# Altium footprint library Connectors.PcbLib: 155 footprints (part 7 of 10)
Each footprint in its own frame and in the unit in brackets; x right, y up, seen from the top. Pads: shape width x height; smd on the part's side, far side on the other; paste and mask are expansions set on the pad; w line width, h text height; cw(c..) or ccw(c..) is an arc to the next point about the centre after c.
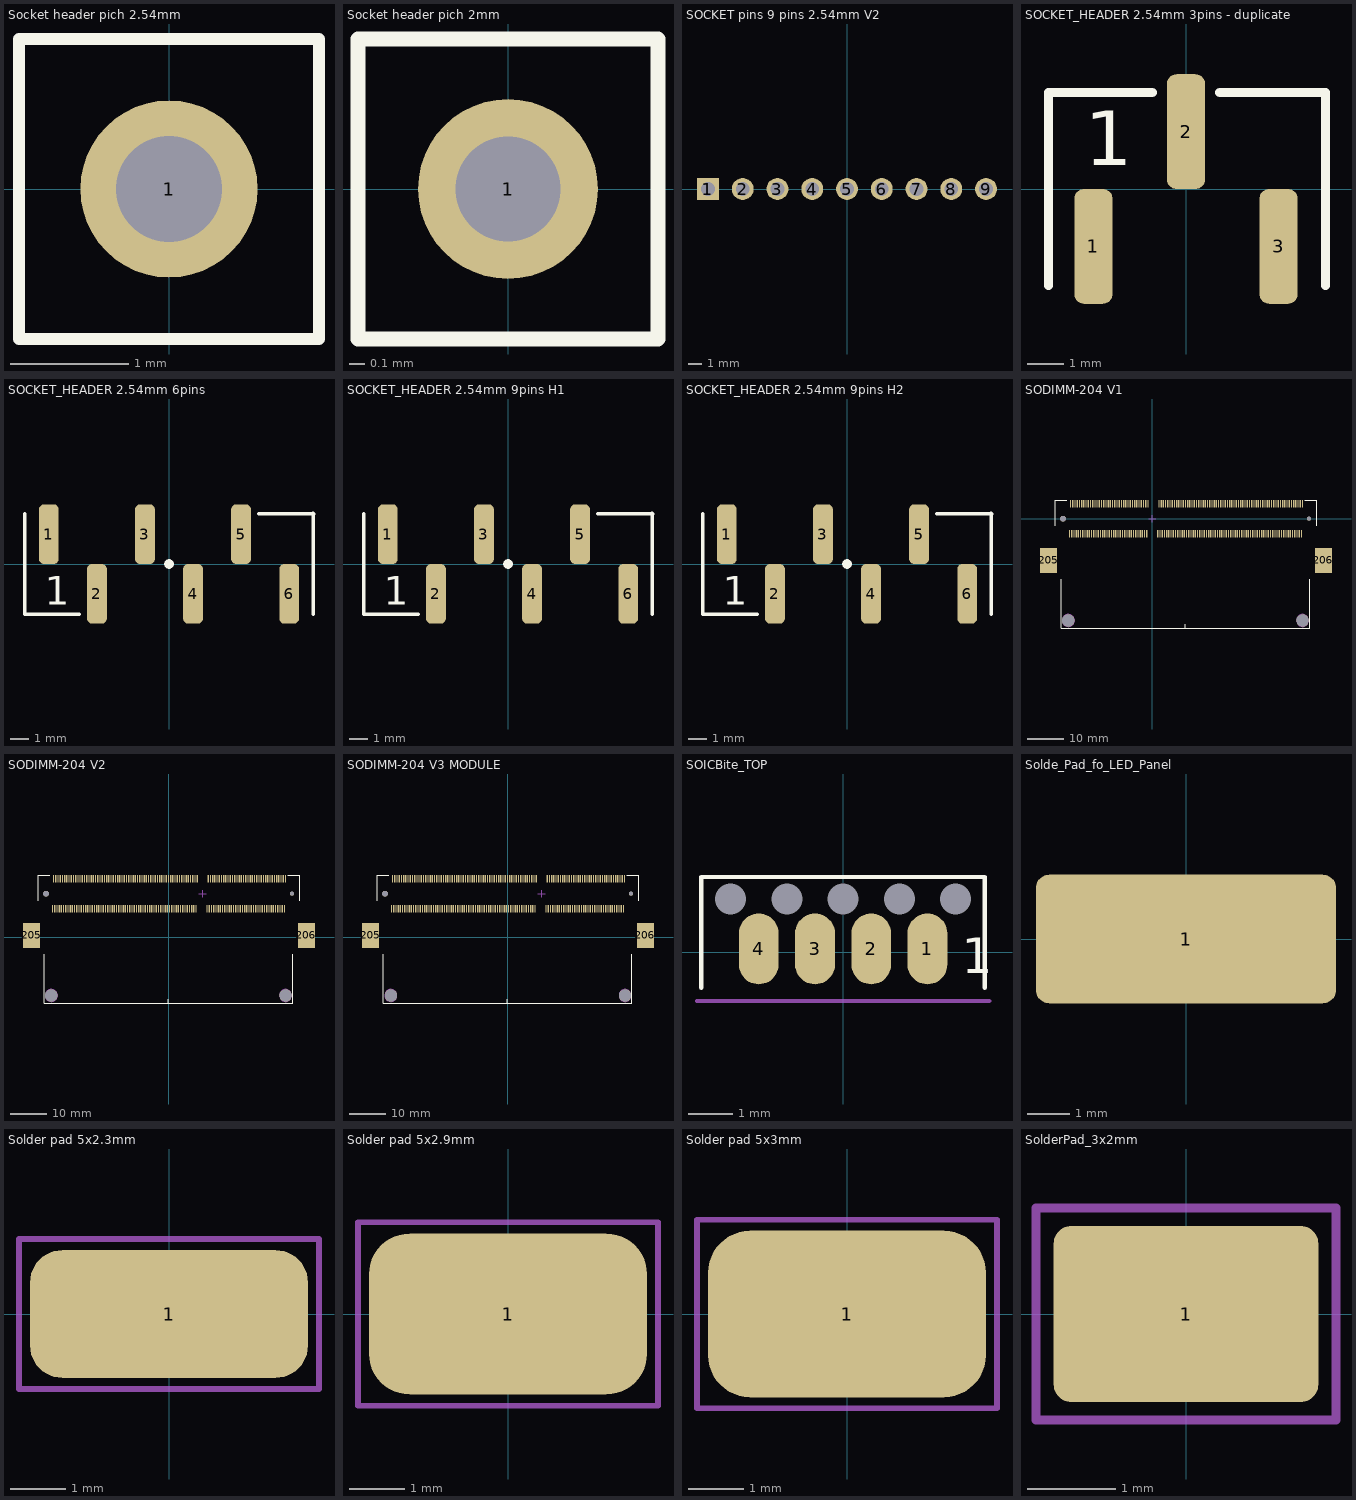
[diagram p6: the footprints below, top view; thin cyan lines are the x and y axes]

## Socket header pich 2.54mm [mm] "Socket header"
pads (1):
  round 1.5 hole 0.9: 1(0,0)
Top Overlay:
  lines w0.1: -1.27,-1.27 -1.27,1.27 1.27,1.27 1.27,-1.27 -1.27,-1.27
3D body: height 14.2, standoff -3.1, extent -1.27,-1.27 1.27,1.27

## Socket header pich 2mm [mm] "Socket header"
pads (1):
  round 1.2 hole 0.7: 1(0,0)
Top Overlay:
  lines w0.1: -1,-1 1,-1 1,1 -1,1 -1,-1
3D body: height 6, standoff -2.8, extent -1,-1 1,1

## SOCKET pins 9 pins 2.54mm V2 [mm] "SOCKET pins 9 pins 2.54mm V2"
pads (9):
  rect 1.6x1.6 hole 1: 1(-10.16,0)
  round 1.6 hole 1: 2(-7.62,0) 3(-5.08,0) 4(-2.54,0) 5(0,0) 6(2.54,0) 7(5.08,0) 8(7.62,0) 9(10.16,0)
3D body: height 7.04, standoff -3, extent -11.43,-1.27 11.43,1.27

## SOCKET_HEADER 2.54mm 3pins - duplicate [mm] "SOCKET_HEADER 2.54mm 3pins"
height 8
pads (3):
  rrect50% 1.05x3.15 smd: 1(-2.54,-1.575) 2(0,1.575) 3(2.54,-1.575)
Top Overlay:
  lines w0.254: -3.775,-2.65 -3.775,2.65 -0.925,2.65 ; 0.925,2.65 3.825,2.65 3.825,-2.65
  text "1" at -2.775,0.65 h1.5
3D body: height 7.99, standoff -0.01, extent -3.785,-2.65 3.835,2.653

## SOCKET_HEADER 2.54mm 6pins [mm] "SOCKET_HEADER 2.54mm 6pins"
height 8
pads (6):
  rrect50% 1.05x3.15 smd: 1(-6.35,1.575) 2(-3.81,-1.575) 3(-1.27,1.575) 4(1.27,-1.575) 5(3.81,1.575) 6(6.35,-1.575)
Top Overlay:
  circle w0.254: c0,0 r0.127
  lines w0.2: -7.625,2.65 -7.625,-2.65 -4.75,-2.65 ; 4.75,2.65 7.6,2.65 ; 7.625,-2.65 7.625,2.625
  lines w0.254: 7.6,2.65 7.625,2.625
  text "1" at -6.575,-2.15 h1.5
3D body: height 7.99, standoff -0.01, extent -7.62,-2.65 7.62,2.653

## SOCKET_HEADER 2.54mm 9pins H1 [mm] "SOCKET_HEADER 2.54mm 9pins H1"
height 8
pads (6):
  rrect50% 1.05x3.15 smd: 1(-6.35,1.575) 2(-3.81,-1.575) 3(-1.27,1.575) 4(1.27,-1.575) 5(3.81,1.575) 6(6.35,-1.575)
Top Overlay:
  circle w0.254: c0,0 r0.127
  lines w0.2: -7.625,2.65 -7.625,-2.65 -4.75,-2.65 ; 4.75,2.65 7.6,2.65 ; 7.625,-2.65 7.625,2.625
  lines w0.254: 7.6,2.65 7.625,2.625
  text "1" at -6.575,-2.15 h1.5
3D body: height 7.99, standoff -0.01, extent -7.62,-2.65 7.62,2.653

## SOCKET_HEADER 2.54mm 9pins H2 [mm] "SOCKET_HEADER 2.54mm 9pins H2"
height 8
pads (6):
  rrect50% 1.05x3.15 smd: 1(-6.35,1.575) 2(-3.81,-1.575) 3(-1.27,1.575) 4(1.27,-1.575) 5(3.81,1.575) 6(6.35,-1.575)
Top Overlay:
  circle w0.254: c0,0 r0.127
  lines w0.2: -7.625,2.65 -7.625,-2.65 -4.75,-2.65 ; 4.75,2.65 7.6,2.65 ; 7.625,-2.65 7.625,2.625
  lines w0.254: 7.6,2.65 7.625,2.625
  text "1" at -6.575,-2.15 h1.5
3D body: height 7.99, standoff -0.01, extent -7.62,-2.65 7.62,2.653

## SODIMM-204 V1 [mm] "SODIMM-204 V1"
height 5
pads (210):
  rect 0.35x2 smd: 1(-22.5,-4.1) 2(-22.2,4.1) 3(-21.9,-4.1) 4(-21.6,4.1) 5(-21.3,-4.1) 6(-21,4.1) 7(-20.7,-4.1) 8(-20.4,4.1) 9(-20.1,-4.1) 10(-19.8,4.1) 11(-19.5,-4.1) 12(-19.2,4.1) 13(-18.9,-4.1) 14(-18.6,4.1) 15(-18.3,-4.1) 16(-18,4.1) 17(-17.7,-4.1) 18(-17.4,4.1) 19(-17.1,-4.1) 20(-16.8,4.1) 21(-16.5,-4.1) 22(-16.2,4.1) 23(-15.9,-4.1) 24(-15.6,4.1) 25(-15.3,-4.1) 26(-15,4.1) 27(-14.7,-4.1) 28(-14.4,4.1) 29(-14.1,-4.1) 30(-13.8,4.1) 31(-13.5,-4.1) 32(-13.2,4.1) 33(-12.9,-4.1) 34(-12.6,4.1) 35(-12.3,-4.1) 36(-12,4.1) 37(-11.7,-4.1) 38(-11.4,4.1) 39(-11.1,-4.1) 40(-10.8,4.1) 41(-10.5,-4.1) 42(-10.2,4.1) 43(-9.9,-4.1) 44(-9.6,4.1) 45(-9.3,-4.1) 46(-9,4.1) 47(-8.7,-4.1) 48(-8.4,4.1) 49(-8.1,-4.1) 50(-7.8,4.1) 51(-7.5,-4.1) 52(-7.2,4.1) 53(-6.9,-4.1) 54(-6.6,4.1) 55(-6.3,-4.1) 56(-6,4.1) 57(-5.7,-4.1) 58(-5.4,4.1) 59(-5.1,-4.1) 60(-4.8,4.1) 61(-4.5,-4.1) 62(-4.2,4.1) 63(-3.9,-4.1) 64(-3.6,4.1) 65(-3.3,-4.1) 66(-3,4.1) 67(-2.7,-4.1) 68(-2.4,4.1) 69(-2.1,-4.1) 70(-1.8,4.1) 71(-1.5,-4.1) 72(-1.2,4.1) 73(1.5,-4.1) 74(1.8,4.1) 75(2.1,-4.1) 76(2.4,4.1) 77(2.7,-4.1) 78(3,4.1) 79(3.3,-4.1) 80(3.6,4.1) 81(3.9,-4.1) 82(4.2,4.1) 83(4.5,-4.1) 84(4.8,4.1) 85(5.1,-4.1) 86(5.4,4.1) 87(5.7,-4.1) 88(6,4.1) 89(6.3,-4.1) 90(6.6,4.1) 91(6.9,-4.1) 92(7.2,4.1) 93(7.5,-4.1) 94(7.8,4.1) 95(8.1,-4.1) 96(8.4,4.1) 97(8.7,-4.1) 98(9,4.1) 99(9.3,-4.1) 100(9.6,4.1) 101(9.9,-4.1) 102(10.2,4.1) 103(10.5,-4.1) 104(10.8,4.1) 105(11.1,-4.1) 106(11.4,4.1) 107(11.7,-4.1) 108(12,4.1) 109(12.3,-4.1) 110(12.6,4.1) 111(12.9,-4.1) 112(13.2,4.1) 113(13.5,-4.1) 114(13.8,4.1) 115(14.1,-4.1) 116(14.4,4.1) 117(14.7,-4.1) 118(15,4.1) 119(15.3,-4.1) 120(15.6,4.1) 121(15.9,-4.1) 122(16.2,4.1) 123(16.5,-4.1) 124(16.8,4.1) 125(17.1,-4.1) 126(17.4,4.1) 127(17.7,-4.1) 128(18,4.1) 129(18.3,-4.1) 130(18.6,4.1) 131(18.9,-4.1) 132(19.2,4.1) 133(19.5,-4.1) 134(19.8,4.1) 135(20.1,-4.1) 136(20.4,4.1) 137(20.7,-4.1) 138(21,4.1) 139(21.3,-4.1) 140(21.6,4.1) 141(21.9,-4.1) 142(22.2,4.1) 143(22.5,-4.1) 144(22.8,4.1) 145(23.1,-4.1) 146(23.4,4.1) 147(23.7,-4.1) 148(24,4.1) 149(24.3,-4.1) 150(24.6,4.1) 151(24.9,-4.1) 152(25.2,4.1) 153(25.5,-4.1) 154(25.8,4.1) 155(26.1,-4.1) 156(26.4,4.1) 157(26.7,-4.1) 158(27,4.1) 159(27.3,-4.1) 160(27.6,4.1) 161(27.9,-4.1) 162(28.2,4.1) 163(28.5,-4.1) 164(28.8,4.1) 165(29.1,-4.1) 166(29.4,4.1) 167(29.7,-4.1) 168(30,4.1) 169(30.3,-4.1) 170(30.6,4.1) 171(30.9,-4.1) 172(31.2,4.1) 173(31.5,-4.1) 174(31.8,4.1) 175(32.1,-4.1) 176(32.4,4.1) 177(32.7,-4.1) 178(33,4.1) 179(33.3,-4.1) 180(33.6,4.1) 181(33.9,-4.1) 182(34.2,4.1) 183(34.5,-4.1) 184(34.8,4.1) 185(35.1,-4.1) 186(35.4,4.1) 187(35.7,-4.1) 188(36,4.1) 189(36.3,-4.1) 190(36.6,4.1) 191(36.9,-4.1) 192(37.2,4.1) 193(37.5,-4.1) 194(37.8,4.1) 195(38.1,-4.1) 196(38.4,4.1) 197(38.7,-4.1) 198(39,4.1) 199(39.3,-4.1) 200(39.6,4.1) 201(39.9,-4.1) 202(40.2,4.1) 203(40.5,-4.1) 204(40.8,4.1)
  rect 4.7x6.8 smd: 205(-28.2,-11.3) 206(46.5,-11.325)
  round 1.6 hole 1.6 unplated: 207(-24.25,0)
  round 1.1 hole 1.1 unplated: 208(42.55,0)
  round 3.3 hole 3.3 unplated: 209(-22.82,-27.64) 210(40.82,-27.64)
Top Overlay:
  lines w0.254: -26.35,-1.85 -26.35,5 -23.2,5 ; -24.8,-16.45 -24.8,-29.7 0,-29.7 42.8,-29.7 42.8,-16.45 ; 9,-29.7 9,-28.7 ; 41.475,5 44.65,5 44.65,-1.85
Mechanical 15:
  circle w0.25: c40.82,-27.64 r1.65
  circle w0.25: c-22.82,-27.64 r1.65
  lines w0.254: -1,0 1,0 ; 0,-1 0,1
3D body: height 9.5, standoff -0.65, extent -28.8,-21.564 47.1,5

## SODIMM-204 V2 [mm] "SODIMM-204 V2"
height 5
pads (210):
  rect 0.35x2 smd: 1(31.65,15.87) 2(31.35,7.67) 3(31.05,15.87) 4(30.75,7.67) 5(30.45,15.87) 6(30.15,7.67) 7(29.85,15.87) 8(29.55,7.67) 9(29.25,15.87) 10(28.95,7.67) 11(28.65,15.87) 12(28.35,7.67) 13(28.05,15.87) 14(27.75,7.67) 15(27.45,15.87) 16(27.15,7.67) 17(26.85,15.87) 18(26.55,7.67) 19(26.25,15.87) 20(25.95,7.67) 21(25.65,15.87) 22(25.35,7.67) 23(25.05,15.87) 24(24.75,7.67) 25(24.45,15.87) 26(24.15,7.67) 27(23.85,15.87) 28(23.55,7.67) 29(23.25,15.87) 30(22.95,7.67) 31(22.65,15.87) 32(22.35,7.67) 33(22.05,15.87) 34(21.75,7.67) 35(21.45,15.87) 36(21.15,7.67) 37(20.85,15.87) 38(20.55,7.67) 39(20.25,15.87) 40(19.95,7.67) 41(19.65,15.87) 42(19.35,7.67) 43(19.05,15.87) 44(18.75,7.67) 45(18.45,15.87) 46(18.15,7.67) 47(17.85,15.87) 48(17.55,7.67) 49(17.25,15.87) 50(16.95,7.67) 51(16.65,15.87) 52(16.35,7.67) 53(16.05,15.87) 54(15.75,7.67) 55(15.45,15.87) 56(15.15,7.67) 57(14.85,15.87) 58(14.55,7.67) 59(14.25,15.87) 60(13.95,7.67) 61(13.65,15.87) 62(13.35,7.67) 63(13.05,15.87) 64(12.75,7.67) 65(12.45,15.87) 66(12.15,7.67) 67(11.85,15.87) 68(11.55,7.67) 69(11.25,15.87) 70(10.95,7.67) 71(10.65,15.87) 72(10.35,7.67) 73(7.65,15.87) 74(7.35,7.67) 75(7.05,15.87) 76(6.75,7.67) 77(6.45,15.87) 78(6.15,7.67) 79(5.85,15.87) 80(5.55,7.67) 81(5.25,15.87) 82(4.95,7.67) 83(4.65,15.87) 84(4.35,7.67) 85(4.05,15.87) 86(3.75,7.67) 87(3.45,15.87) 88(3.15,7.67) 89(2.85,15.87) 90(2.55,7.67) 91(2.25,15.87) 92(1.95,7.67) 93(1.65,15.87) 94(1.35,7.67) 95(1.05,15.87) 96(0.75,7.67) 97(0.45,15.87) 98(0.15,7.67) 99(-0.15,15.87) 100(-0.45,7.67) 101(-0.75,15.87) 102(-1.05,7.67) 103(-1.35,15.87) 104(-1.65,7.67) 105(-1.95,15.87) 106(-2.25,7.67) 107(-2.55,15.87) 108(-2.85,7.67) 109(-3.15,15.87) 110(-3.45,7.67) 111(-3.75,15.87) 112(-4.05,7.67) 113(-4.35,15.87) 114(-4.65,7.67) 115(-4.95,15.87) 116(-5.25,7.67) 117(-5.55,15.87) 118(-5.85,7.67) 119(-6.15,15.87) 120(-6.45,7.67) 121(-6.75,15.87) 122(-7.05,7.67) 123(-7.35,15.87) 124(-7.65,7.67) 125(-7.95,15.87) 126(-8.25,7.67) 127(-8.55,15.87) 128(-8.85,7.67) 129(-9.15,15.87) 130(-9.45,7.67) 131(-9.75,15.87) 132(-10.05,7.67) 133(-10.35,15.87) 134(-10.65,7.67) 135(-10.95,15.87) 136(-11.25,7.67) 137(-11.55,15.87) 138(-11.85,7.67) 139(-12.15,15.87) 140(-12.45,7.67) 141(-12.75,15.87) 142(-13.05,7.67) 143(-13.35,15.87) 144(-13.65,7.67) 145(-13.95,15.87) 146(-14.25,7.67) 147(-14.55,15.87) 148(-14.85,7.67) 149(-15.15,15.87) 150(-15.45,7.67) 151(-15.75,15.87) 152(-16.05,7.67) 153(-16.35,15.87) 154(-16.65,7.67) 155(-16.95,15.87) 156(-17.25,7.67) 157(-17.55,15.87) 158(-17.85,7.67) 159(-18.15,15.87) 160(-18.45,7.67) 161(-18.75,15.87) 162(-19.05,7.67) 163(-19.35,15.87) 164(-19.65,7.67) 165(-19.95,15.87) 166(-20.25,7.67) 167(-20.55,15.87) 168(-20.85,7.67) 169(-21.15,15.87) 170(-21.45,7.67) 171(-21.75,15.87) 172(-22.05,7.67) 173(-22.35,15.87) 174(-22.65,7.67) 175(-22.95,15.87) 176(-23.25,7.67) 177(-23.55,15.87) 178(-23.85,7.67) 179(-24.15,15.87) 180(-24.45,7.67) 181(-24.75,15.87) 182(-25.05,7.67) 183(-25.35,15.87) 184(-25.65,7.67) 185(-25.95,15.87) 186(-26.25,7.67) 187(-26.55,15.87) 188(-26.85,7.67) 189(-27.15,15.87) 190(-27.45,7.67) 191(-27.75,15.87) 192(-28.05,7.67) 193(-28.35,15.87) 194(-28.65,7.67) 195(-28.95,15.87) 196(-29.25,7.67) 197(-29.55,15.87) 198(-29.85,7.67) 199(-30.15,15.87) 200(-30.45,7.67) 201(-30.75,15.87) 202(-31.05,7.67) 203(-31.35,15.87) 204(-31.65,7.67)
  rect 4.7x6.8 smd: 205(-37.35,0.47) 206(37.35,0.445)
  round 1.6 hole 1.6 unplated: 207(-33.4,11.77)
  round 1.1 hole 1.1 unplated: 208(33.4,11.77)
  round 3.3 hole 3.3 unplated: 209(-31.97,-15.87) 210(31.67,-15.87)
Top Overlay:
  lines w0.254: -35.5,9.92 -35.5,16.77 -32.35,16.77 ; -33.95,-4.68 -33.95,-17.93 -9.15,-17.93 33.65,-17.93 33.65,-4.68 ; -0.15,-17.93 -0.15,-16.93 ; 32.325,16.77 35.5,16.77 35.5,9.92
Mechanical 15:
  circle w0.25: c-31.97,-15.87 r1.65
  circle w0.25: c31.67,-15.87 r1.65
  lines w0.254: 8.15,11.77 10.15,11.77 ; 9.15,10.77 9.15,12.77
3D body: height 9.5, standoff -0.65, extent -38,-9.788 38,16.775

## SODIMM-204 V3 MODULE [mm] "SODIMM-204 V3 MODULE"
height 5
pads (210):
  rect 0.35x2 smd: 1(31.65,15.87) 2(31.35,7.67) 3(31.05,15.87) 4(30.75,7.67) 5(30.45,15.87) 6(30.15,7.67) 7(29.85,15.87) 8(29.55,7.67) 9(29.25,15.87) 10(28.95,7.67) 11(28.65,15.87) 12(28.35,7.67) 13(28.05,15.87) 14(27.75,7.67) 15(27.45,15.87) 16(27.15,7.67) 17(26.85,15.87) 18(26.55,7.67) 19(26.25,15.87) 20(25.95,7.67) 21(25.65,15.87) 22(25.35,7.67) 23(25.05,15.87) 24(24.75,7.67) 25(24.45,15.87) 26(24.15,7.67) 27(23.85,15.87) 28(23.55,7.67) 29(23.25,15.87) 30(22.95,7.67) 31(22.65,15.87) 32(22.35,7.67) 33(22.05,15.87) 34(21.75,7.67) 35(21.45,15.87) 36(21.15,7.67) 37(20.85,15.87) 38(20.55,7.67) 39(20.25,15.87) 40(19.95,7.67) 41(19.65,15.87) 42(19.35,7.67) 43(19.05,15.87) 44(18.75,7.67) 45(18.45,15.87) 46(18.15,7.67) 47(17.85,15.87) 48(17.55,7.67) 49(17.25,15.87) 50(16.95,7.67) 51(16.65,15.87) 52(16.35,7.67) 53(16.05,15.87) 54(15.75,7.67) 55(15.45,15.87) 56(15.15,7.67) 57(14.85,15.87) 58(14.55,7.67) 59(14.25,15.87) 60(13.95,7.67) 61(13.65,15.87) 62(13.35,7.67) 63(13.05,15.87) 64(12.75,7.67) 65(12.45,15.87) 66(12.15,7.67) 67(11.85,15.87) 68(11.55,7.67) 69(11.25,15.87) 70(10.95,7.67) 71(10.65,15.87) 72(10.35,7.67) 73(7.65,15.87) 74(7.35,7.67) 75(7.05,15.87) 76(6.75,7.67) 77(6.45,15.87) 78(6.15,7.67) 79(5.85,15.87) 80(5.55,7.67) 81(5.25,15.87) 82(4.95,7.67) 83(4.65,15.87) 84(4.35,7.67) 85(4.05,15.87) 86(3.75,7.67) 87(3.45,15.87) 88(3.15,7.67) 89(2.85,15.87) 90(2.55,7.67) 91(2.25,15.87) 92(1.95,7.67) 93(1.65,15.87) 94(1.35,7.67) 95(1.05,15.87) 96(0.75,7.67) 97(0.45,15.87) 98(0.15,7.67) 99(-0.15,15.87) 100(-0.45,7.67) 101(-0.75,15.87) 102(-1.05,7.67) 103(-1.35,15.87) 104(-1.65,7.67) 105(-1.95,15.87) 106(-2.25,7.67) 107(-2.55,15.87) 108(-2.85,7.67) 109(-3.15,15.87) 110(-3.45,7.67) 111(-3.75,15.87) 112(-4.05,7.67) 113(-4.35,15.87) 114(-4.65,7.67) 115(-4.95,15.87) 116(-5.25,7.67) 117(-5.55,15.87) 118(-5.85,7.67) 119(-6.15,15.87) 120(-6.45,7.67) 121(-6.75,15.87) 122(-7.05,7.67) 123(-7.35,15.87) 124(-7.65,7.67) 125(-7.95,15.87) 126(-8.25,7.67) 127(-8.55,15.87) 128(-8.85,7.67) 129(-9.15,15.87) 130(-9.45,7.67) 131(-9.75,15.87) 132(-10.05,7.67) 133(-10.35,15.87) 134(-10.65,7.67) 135(-10.95,15.87) 136(-11.25,7.67) 137(-11.55,15.87) 138(-11.85,7.67) 139(-12.15,15.87) 140(-12.45,7.67) 141(-12.75,15.87) 142(-13.05,7.67) 143(-13.35,15.87) 144(-13.65,7.67) 145(-13.95,15.87) 146(-14.25,7.67) 147(-14.55,15.87) 148(-14.85,7.67) 149(-15.15,15.87) 150(-15.45,7.67) 151(-15.75,15.87) 152(-16.05,7.67) 153(-16.35,15.87) 154(-16.65,7.67) 155(-16.95,15.87) 156(-17.25,7.67) 157(-17.55,15.87) 158(-17.85,7.67) 159(-18.15,15.87) 160(-18.45,7.67) 161(-18.75,15.87) 162(-19.05,7.67) 163(-19.35,15.87) 164(-19.65,7.67) 165(-19.95,15.87) 166(-20.25,7.67) 167(-20.55,15.87) 168(-20.85,7.67) 169(-21.15,15.87) 170(-21.45,7.67) 171(-21.75,15.87) 172(-22.05,7.67) 173(-22.35,15.87) 174(-22.65,7.67) 175(-22.95,15.87) 176(-23.25,7.67) 177(-23.55,15.87) 178(-23.85,7.67) 179(-24.15,15.87) 180(-24.45,7.67) 181(-24.75,15.87) 182(-25.05,7.67) 183(-25.35,15.87) 184(-25.65,7.67) 185(-25.95,15.87) 186(-26.25,7.67) 187(-26.55,15.87) 188(-26.85,7.67) 189(-27.15,15.87) 190(-27.45,7.67) 191(-27.75,15.87) 192(-28.05,7.67) 193(-28.35,15.87) 194(-28.65,7.67) 195(-28.95,15.87) 196(-29.25,7.67) 197(-29.55,15.87) 198(-29.85,7.67) 199(-30.15,15.87) 200(-30.45,7.67) 201(-30.75,15.87) 202(-31.05,7.67) 203(-31.35,15.87) 204(-31.65,7.67)
  rect 4.7x6.8 smd: 205(-37.35,0.47) 206(37.35,0.445)
  round 1.6 hole 1.6 unplated: 207(-33.4,11.77)
  round 1.1 hole 1.1 unplated: 208(33.4,11.77)
  round 3.3 hole 3.3 unplated: 209(-31.815,-15.87) 210(31.815,-15.87)
Top Overlay:
  lines w0.254: -35.5,9.92 -35.5,16.77 -32.35,16.77 ; -33.95,-4.68 -33.95,-17.93 -9.15,-17.93 33.65,-17.93 33.65,-4.68 ; -0.15,-17.93 -0.15,-16.93 ; 32.325,16.77 35.5,16.77 35.5,9.92
Mechanical 15:
  circle w0.25: c31.815,-15.87 r1.65
  circle w0.25: c-31.815,-15.87 r1.65
  lines w0.254: 8.15,11.77 10.15,11.77 ; 9.15,10.77 9.15,12.77
3D body: height 5.75, standoff -0.65, extent -35.8,-18.1 35.8,16.75

## SOICBite_TOP [mm]
pads (9):
  rrect20% 0x0 hole 0.7 unplated: 0(-2.54,1.2) 0(-1.27,1.2) 0(0,1.2) 0(1.27,1.2) 0(2.54,1.2)
  oval 0.9x1.6 smd paste-2: 1(1.905,0.075) 2(0.635,0.075) 3(-0.635,0.075) 4(-1.905,0.075)
Top Overlay:
  lines w0.1: -3.2,-0.8 -3.2,1.7 3.2,1.7 3.2,-0.8
  text "1" at 2.675,-0.475 h0.8
Mechanical 13:
  lines w0.1: -3.3,-1.1 3.3,-1.1
  text "PCB edge" at -3.125,-0.975 h0.3

## Solde_Pad_fo_LED_Panel [mm]
pads (1):
  rrect20% 7x3 smd paste-7: 1(0,0)

## Solder pad 5x2.3mm [mm]
pads (1):
  rrect50% 5x2.3 smd paste-10: 1(0,0)
Mechanical 15:
  lines w0.1: -2.7,-1.35 2.7,-1.35 2.7,1.35 -2.7,1.35 -2.7,-1.35

## Solder pad 5x2.9mm [mm]
pads (1):
  rrect50% 5x2.9 smd paste-10: 1(0,0)
Mechanical 15:
  lines w0.1: -2.7,-1.65 -2.7,1.65 2.7,1.65 2.7,-1.65 -2.7,-1.65

## Solder pad 5x3mm [mm]
pads (1):
  rrect50% 5x3 smd paste-10: 1(0,0)
Mechanical 15:
  lines w0.1: -2.7,-1.7 2.7,-1.7 2.7,1.7 -2.7,1.7 -2.7,-1.7

## SolderPad_3x2mm [mm]
pads (1):
  rrect20% 3x2 smd: 1(0,0)
Mechanical 15:
  lines w0.1: -1.7,-1.2 1.7,-1.2 1.7,1.2 -1.7,1.2 -1.7,-1.2